# Altium footprint library Face_InMain1V0.PcbLib: 83 footprints (part 5 of 6)
Each footprint in its own frame and in the unit in brackets; x right, y up, seen from the top. Pads: shape width x height; smd on the part's side, far side on the other; paste and mask are expansions set on the pad; w line width, h text height; cw(c..) or ccw(c..) is an arc to the next point about the centre after c.
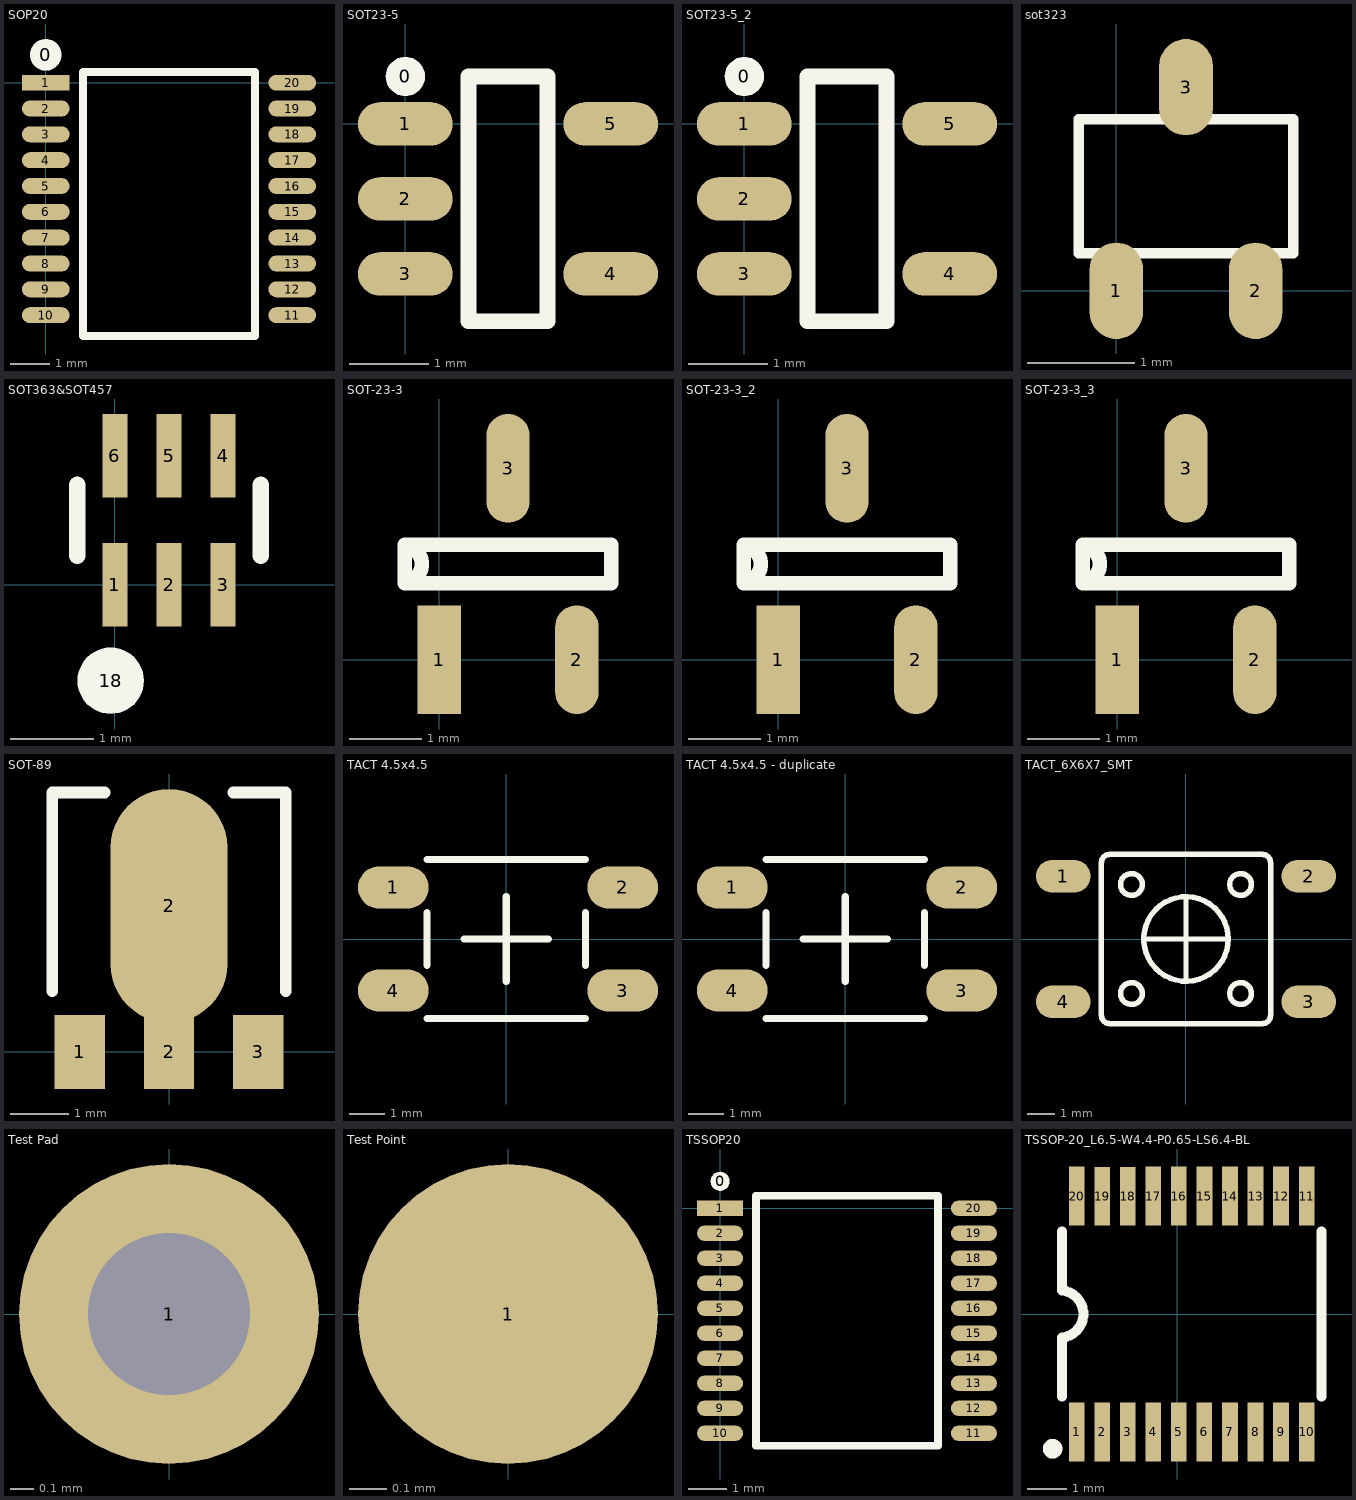
[diagram p4: the footprints below, top view; thin cyan lines are the x and y axes]

## SOP20 [mm]
height 6.3
pads (21):
  round 0.8 on Top Overlay: 0(0,0.7)
  rect 1.2x0.4 smd: 1(0,0)
  oval 1.2x0.4 smd: 2(0,-0.65) 3(0,-1.3) 4(0,-1.95) 5(0,-2.6) 6(0,-3.25) 7(0,-3.9) 8(0,-4.55) 9(0,-5.2) 10(0,-5.85) 11(6.2,-5.85) 12(6.2,-5.2) 13(6.2,-4.55) 14(6.2,-3.9) 15(6.2,-3.25) 16(6.2,-2.6) 17(6.2,-1.95) 18(6.2,-1.3) 19(6.2,-0.65) 20(6.2,0)
Top Overlay:
  lines w0.2: 0.935,-6.37 0.935,0.27 5.265,0.27 5.265,-6.37 0.935,-6.37
3D body "User Library-TSSOP20_TP.STEP": height 1.1, standoff -0.09, extent 0.01,-6.28 6.29,0.22

## SOT23-5 [mm]
pads (6):
  round 0.5 on Top Overlay: 0(0,0.6)
  oval 1.2x0.55 smd: 1(0,0) 2(0,-0.95) 3(0,-1.9) 4(2.6,-1.9) 5(2.6,0)
Top Overlay:
  lines w0.2: 0.8,-2.5 0.8,0.6 1.8,0.6 1.8,-2.5 0.8,-2.5

## SOT23-5_2 [mm]
pads (6):
  round 0.5 on Top Overlay: 0(0,0.6)
  oval 1.2x0.55 smd: 1(0,0) 2(0,-0.95) 3(0,-1.9) 4(2.6,-1.9) 5(2.6,0)
Top Overlay:
  lines w0.2: 0.8,-2.5 0.8,0.6 1.8,0.6 1.8,-2.5 0.8,-2.5

## sot323 [mm]
pads (3):
  oval 0.5x0.9 smd: 1(0,0) 2(1.3,0) 3(0.65,1.9)
Top Overlay:
  lines w0.1: -0.35,0.35 -0.35,1.6 1.65,1.6 1.65,0.35 -0.35,0.35
3D body "User Library-sc70-3.STEP": height 1, standoff 0, extent -0.4,-0.17 1.7,2.13

## SOT363&SOT457 [mm]
pads (7):
  rect 0.3x1 smd: 1(0,0) 2(0.65,0) 3(1.3,0) 4(1.3,1.55) 5(0.65,1.55) 6(0,1.55)
  round 0.8 on Top Overlay: 18(-0.05,-1.15)
Top Overlay:
  lines w0.2: -0.45,0.35 -0.45,1.2 ; 1.75,0.35 1.75,1.2
3D body "User Library-sot363.STEP": height 1, standoff 0, extent -0.4,-0.37 1.7,1.93

## SOT-23-3 [mm]
pads (3):
  rect 0.6x1.5 smd: 1(0,0)
  oval 0.6x1.5 smd: 2(1.9,0) 3(0.95,2.64)
Top Overlay:
  lines w0.2: -0.475,1.055 2.375,1.055 2.375,1.585 -0.475,1.585 -0.475,1.082 ccw(c-0.475,1.32) -0.475,1.557 -0.475,1.055
3D body "User Library-SOT23-3.STEP": height 1.3, standoff 0, extent -0.49,-0.12 2.41,2.68

## SOT-23-3_2 [mm]
pads (3):
  rect 0.6x1.5 smd: 1(0,0)
  oval 0.6x1.5 smd: 2(1.9,0) 3(0.95,2.64)
Top Overlay:
  lines w0.2: -0.475,1.055 2.375,1.055 2.375,1.585 -0.475,1.585 -0.475,1.082 ccw(c-0.475,1.32) -0.475,1.557 -0.475,1.055
3D body "User Library-SOT23-3.STEP": height 1.3, standoff 0, extent -0.49,-0.12 2.41,2.68

## SOT-23-3_3 [mm]
pads (3):
  rect 0.6x1.5 smd: 1(0,0)
  oval 0.6x1.5 smd: 2(1.9,0) 3(0.95,2.64)
Top Overlay:
  lines w0.2: -0.475,1.055 2.375,1.055 2.375,1.585 -0.475,1.585 -0.475,1.082 ccw(c-0.475,1.32) -0.475,1.557 -0.475,1.055
3D body "User Library-SOT23-3.STEP": height 1.3, standoff 0, extent -0.49,-0.12 2.41,2.68

## SOT-89 [mil]
pads (4):
  rect 34x50 smd: 1(-60,0) 2(0,0) 3(60,0)
  oval 78.74x157.48 smd: 2(0,98.43)
Top Overlay:
  lines w7.87: -78.74,40.94 -78.74,174.8 -43.31,174.8 ; 43.31,174.8 78.74,174.8 78.74,40.94
3D body "SW3dPS-SOT89.STEP": height 70.44, standoff 7.12, extent -89.94,-10.93 91.17,156.4

## TACT 4.5x4.5 [mm]
pads (4):
  oval 2x1.2 smd: 1(-3.2,1.46) 2(3.3,1.46) 3(3.3,-1.46) 4(-3.2,-1.46)
Top Overlay:
  lines w0.2: -2.25,-2.25 2.25,-2.25 ; -2.25,-0.75 -2.25,0.75 ; -2.25,2.25 2.25,2.25 ; -1.2,0 1.2,0 ; 0,-1.2 0,1.2 ; 2.25,-0.75 2.25,0.75
3D body "4.5-4.5-4.3.SLDPRT": height 4.3, standoff 0, extent -2.25,-2.25 2.25,2.25

## TACT 4.5x4.5 - duplicate [mm]
pads (4):
  oval 2x1.2 smd: 1(-3.2,1.46) 2(3.3,1.46) 3(3.3,-1.46) 4(-3.2,-1.46)
Top Overlay:
  lines w0.2: -2.25,-2.25 2.25,-2.25 ; -2.25,-0.75 -2.25,0.75 ; -2.25,2.25 2.25,2.25 ; -1.2,0 1.2,0 ; 0,-1.2 0,1.2 ; 2.25,-0.75 2.25,0.75

## TACT_6X6X7_SMT [mm] "Tactile Switch SMT 6X6"
pads (4):
  oval 2x1.2 smd: 1(-4.5,2.3) 2(4.5,2.3) 3(4.5,-2.3) 4(-4.5,-2.3)
Top Overlay:
  circle w0.2: c2,2 r0.4
  circle w0.2: c2,-2 r0.4
  circle w0.2: c-2,-2 r0.4
  circle w0.2: c0,0 r1.55
  circle w0.2: c-2,2 r0.4
  lines w0.2: -1.5,0 0,0 ; 0,-1.5 0,0 ; 0,1.5 0,0 ; 1.5,0 0,0 ; -3.1,-2.8 ccw(c-2.8,-2.8) -2.8,-3.1 2.8,-3.1 ccw(c2.8,-2.8) 3.1,-2.8 3.1,2.8 ccw(c2.8,2.8) 2.8,3.1 -2.8,3.1 ccw(c-2.8,2.8) -3.1,2.8 -3.1,-2.8
3D body "TACT_6X6X7_SMT.STEP": height 7, standoff 0, extent -4.5,-3 4.5,3

## Test Pad [mm]
pads (1):
  round 1.3 hole 0.7: 1(0,0)

## Test Point [mm]
pads (1):
  round 0.8 smd mask+0: 1(0,0)

## TSSOP20 [mm]
pads (21):
  round 0.5 on Top Overlay: 0(0,0.7)
  rect 1.2x0.4 smd: 1(0,0)
  oval 1.2x0.4 smd: 2(0,-0.65) 3(0,-1.3) 4(0,-1.95) 5(0,-2.6) 6(0,-3.25) 7(0,-3.9) 8(0,-4.55) 9(0,-5.2) 10(0,-5.85) 11(6.6,-5.85) 12(6.6,-5.2) 13(6.6,-4.55) 14(6.6,-3.9) 15(6.6,-3.25) 16(6.6,-2.6) 17(6.6,-1.95) 18(6.6,-1.3) 19(6.6,-0.65) 20(6.6,0)
Top Overlay:
  lines w0.2: 0.935,-6.175 5.665,-6.175 5.665,0.325 0.935,0.325 0.935,-6.175
3D body "SW3dPS-TSSOP-20.STEP": height 1.2, standoff 0, extent 0.035,-6.22 6.585,0.38

## TSSOP-20_L6.5-W4.4-P0.65-LS6.4-BL [mm]
pads (20):
  rect 0.4x1.494 smd: 1(-2.562,-3.001) 2(-1.912,-3.001) 3(-1.262,-3.001) 4(-0.612,-3.001) 5(0.038,-3.001) 6(0.687,-3.001) 7(1.338,-3.001) 8(1.988,-3.001) 9(2.638,-3.001) 10(3.288,-3.001) 11(3.288,3.001) 12(2.638,3.001) 13(1.988,3.001) 14(1.338,3.001) 15(0.688,3.001) 16(0.038,3.001) 17(-0.612,3.001) 18(-1.262,2.996) 19(-1.912,2.996) 20(-2.562,3.001)
Top Overlay:
  lines w0.25: -3.048,-3.429 cw(c-3.173,-3.428) -3.048,-3.426
  lines w0.254: -2.937,-2.105 -2.937,-2.105 -2.937,-0.6 ccw(c-2.993,0) -2.937,0.6 -2.937,2.105 ; 3.663,2.105 3.663,-2.105 3.664,-2.105